# Altium footprint library PCB_CONNECTORS.PcbLib: 676 footprints (part 3 of 43)
Each footprint in its own frame and in the unit in brackets; x right, y up, seen from the top. Pads: shape width x height; smd on the part's side, far side on the other; paste and mask are expansions set on the pad; w line width, h text height; cw(c..) or ccw(c..) is an arc to the next point about the centre after c.
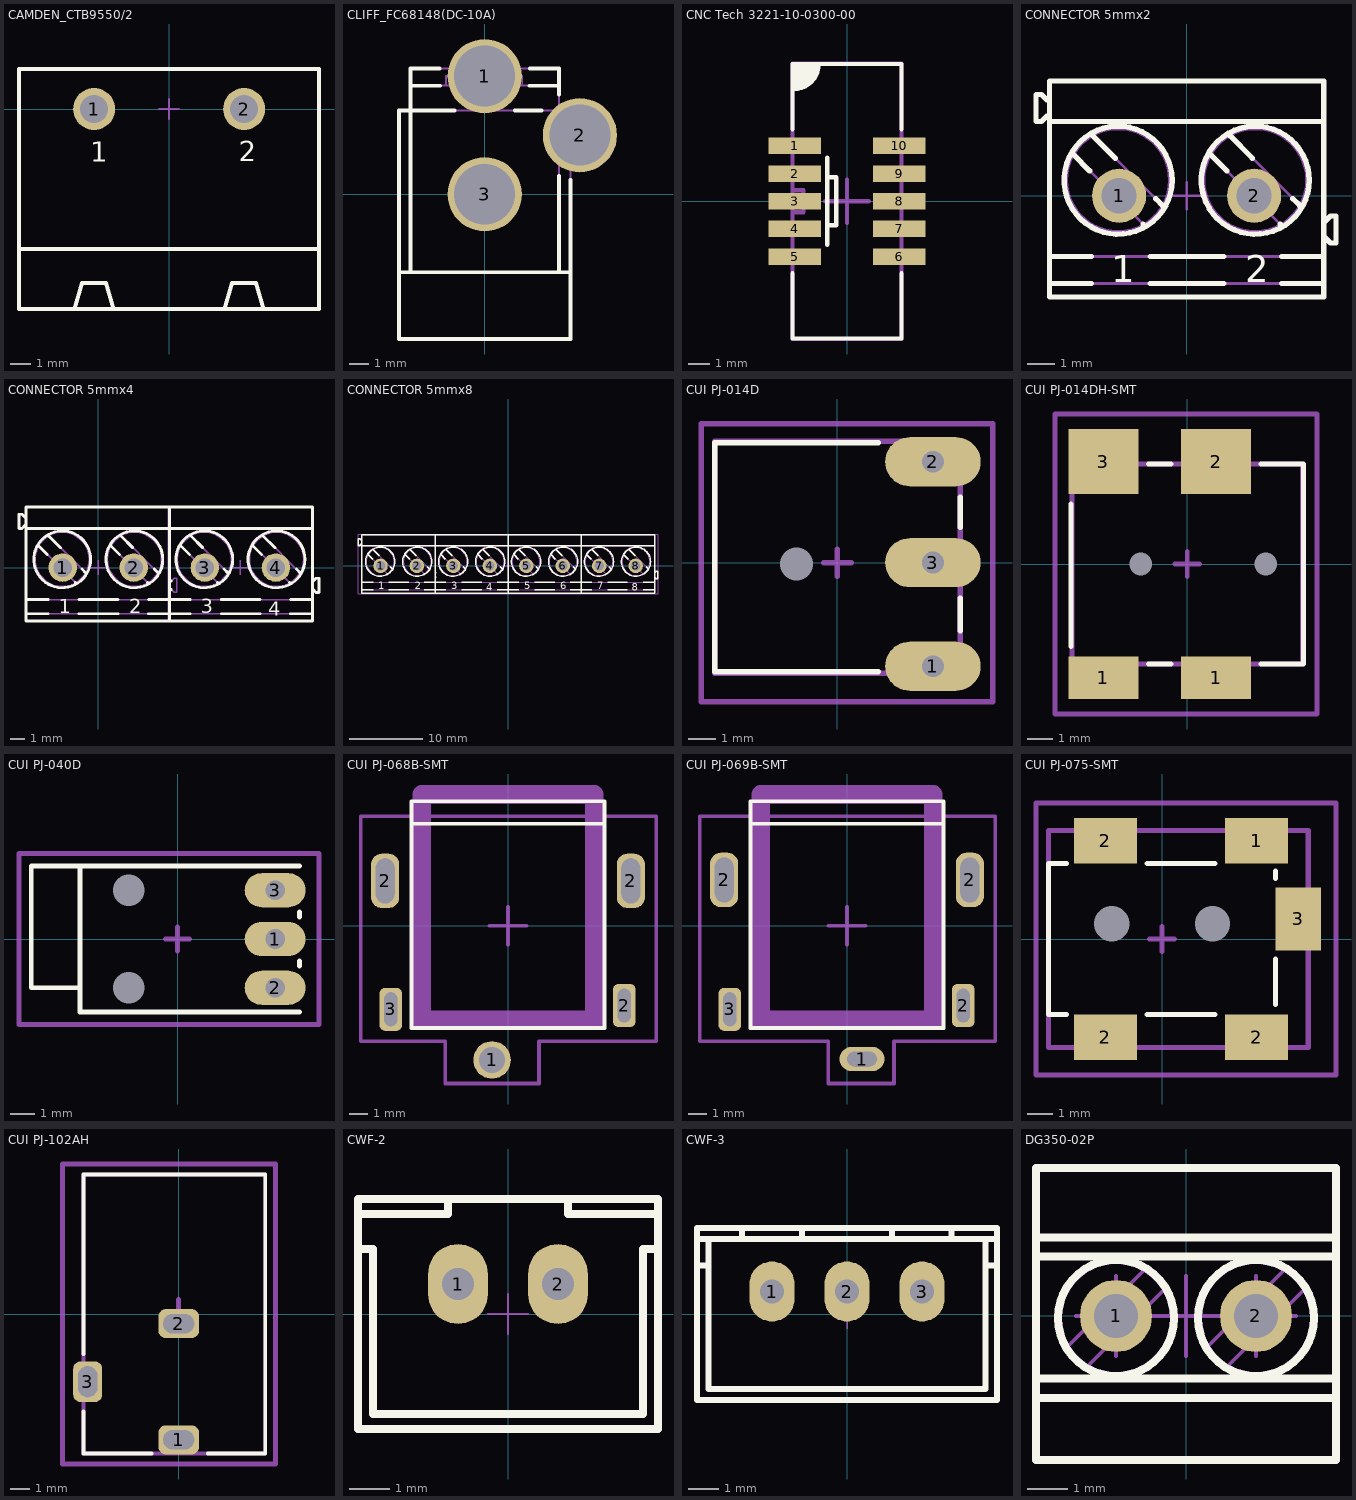
[diagram p2: the footprints below, top view; thin cyan lines are the x and y axes]

## CAMDEN_CTB9550/2 [mm] "12A, 750V, Pitch: 7.5mm, 2 Positions, Horizontal  Male Terminal Block"
height 8.3
pads (2):
  round 2.1 hole 1.4: 1(-3.75,0) 2(3.75,0)
Top Overlay:
  lines w0.2: -7.505,-7 7.495,-7 ; -4.73,-10 -4.36,-8.7 -3.15,-8.7 -2.78,-10 ; 2.77,-10 3.14,-8.7 4.35,-8.7 4.72,-10 ; -7.505,-10 -7.505,2 7.495,2 7.495,-10 -7.505,-10
  text "1" at -3.95,-2.65 h1
  text "2" at 3.49,-2.625 h1
Mechanical 8:
  lines w0.1: -4.25,0 -3.75,0 ; -3.75,-0.5 -3.75,0 ; -3.75,0.5 -3.75,0 ; -3.25,0 -3.75,0 ; -0.5,0 0,0 ; 0,-0.5 0,0 ; 0,0.5 0,0 ; 0.5,0 0,0 ; 3.25,0 3.75,0 ; 3.75,-0.5 3.75,0 ; 3.75,0.5 3.75,0 ; 4.25,0 3.75,0
Mechanical 14:
  lines w0.1: -7.505,-7 7.495,-7 ; -4.73,-10 -4.36,-8.7 -3.15,-8.7 -2.78,-10 ; 2.77,-10 3.14,-8.7 4.35,-8.7 4.72,-10 ; -7.505,-10 -7.505,2 7.495,2 7.495,-10 -7.505,-10
  text "1" at -3.95,-2.65 h1
  text "2" at 3.49,-2.625 h1
3D body "CAMDEN_CTB9550-2.stp": height 8.3, standoff -3.5, extent -7.505,-10 7.495,2

## CLIFF_FC68148(DC-10A) [mm] "12V /  5A, 2.1mm Diameter Pin, DC Power Socket With  Switch. DC10A Type"
height 11
pads (3):
  round 3.9 hole 3.2: 1(0,6.2) 2(5,3.1) 3(0,0)
Top Overlay:
  lines w0.2: -4.5,-4.1 4.5,-4.1 ; -3.9,-4.1 -3.9,6.6 -2.366,6.6 ; -3.9,5.7 -2.347,5.7 ; -1.587,4.4 -4.5,4.4 -4.5,-7.6 4.5,-7.6 4.5,0.753 ; 1.587,4.4 2.983,4.4 ; 2.347,5.7 3.9,5.7 ; 2.366,6.6 3.9,6.6 3.9,5.233 ; 3.9,-4.1 3.9,0.967
Mechanical 8:
  lines w0.1: -0.5,0 0,0 ; -0.5,6.2 0,6.2 ; 0,-0.5 0,0 ; 0,0.5 0,0 ; 0,5.7 0,6.2 ; 0,6.7 0,6.2 ; 0.5,0 0,0 ; 0.5,6.2 0,6.2 ; 4.5,3.1 5,3.1 ; 5,2.6 5,3.1 ; 5,3.6 5,3.1 ; 5.5,3.1 5,3.1
Mechanical 14:
  lines w0.1: -4.5,-4.1 4.5,-4.1 ; -3.9,-4.1 -3.9,6.6 -1.4,6.6 -1.4,6.2 ; -3.9,5.7 3.9,5.7 ; -2.029,5.7 -2.029,6.2 1.971,6.2 1.971,5.7 ; -1.372,6.2 cw(c-1.025,6.15) -1.025,6.5 0.975,6.5 ; 0.967,6.5 cw(c0.967,6.15) 1.314,6.2 ; 1.4,6.2 1.4,6.6 3.9,6.6 3.9,-4.1 ; 4.5,1.9 5.2,1.9 5.2,4.4 -4.5,4.4 -4.5,-7.6 4.5,-7.6 4.5,4.4 ; 5,1.9 5,4.4
3D body "CLIFF_FC68148(DC-10A).stp": height 11, standoff -3.5, extent -4.5,-7.6 5.2,6.6

## CNC Tech 3221-10-0300-00 [mm]
height 5.6
pads (10):
  rect 2.4x0.76 smd: 1(-2.4,2.54) 2(-2.4,1.27) 3(-2.4,0) 4(-2.4,-1.27) 5(-2.4,-2.54) 6(2.4,-2.54) 7(2.4,-1.27) 8(2.4,0) 9(2.4,1.27) 10(2.4,2.54)
Top Overlay:
  region: -1.3,6.3 -1.3,5.9 -2.05,5.15 -2.45,5.15 -2.45,6.25 -2.5,6.3
  lines w0.2: -2.5,-3.3 -2.5,-6.3 2.5,-6.3 2.5,-3.3 ; -2.5,3.3 -2.5,6.3 ; -2.5,5.15 -2.45,5.15 ccw(c-2.45,6.3) -1.3,6.3 ; -2.3,6.3 -2.5,6.3 ; -0.9,-2 -0.9,-1.1 ; -0.9,2 -0.9,1.1 ; 2.5,3.3 2.5,6.3 -2.5,6.3 ; -0.9,-1.1 -0.9,1.1 ; -0.9,-1.1 -0.5,-1.1 -0.5,1.1 -0.9,1.1
Mechanical 1:
  lines w0.2: -2.45,-0.5 -2,-0.5 -2,0 -2,0.5 -2.45,0.5 ; -2.5,-6.325 -2.5,6.325 2.5,6.325 2.5,-6.325 -2.5,-6.325
Mechanical 15:
  lines w0.2: -1,0 1,0 ; 0,-1 0,1
3D body "CNC Tech 3221-10-0300-00.STEP": height 5.6, standoff 0, extent -2.75,-6.325 2.75,6.325

## CONNECTOR 5mmx2 [mm] "Terminal Block, 24A 600V, Pitch 5.08mm, 2 Positions, Screw Connection"
height 10
pads (2):
  round 2 hole 1.3: 1(-2.5,0) 2(2.5,0)
Top Overlay:
  circle w0.2: c-2.54,0.577 r2
  circle w0.2: c2.54,0.577 r2
  lines w0.2: -5.08,-3.25 -3.525,-3.25 ; -5.08,-2.25 -3.525,-2.25 ; -5.08,2.75 5.08,2.75 ; -5.08,2.95 -5.18,2.95 -5.38,2.75 -5.58,2.75 -5.58,3.75 -5.38,3.75 -5.18,3.55 -5.08,3.55 ; -4.19,1.52 -3.593,0.923 ; -3.483,2.227 -2.651,1.396 ; -1.617,-1.053 -1.597,-1.073 ; -1.35,-3.25 1.375,-3.25 ; -1.35,-2.25 1.375,-2.25 ; -1.144,-0.111 -0.89,-0.366 ; 0.89,1.52 1.487,0.923 ; 1.597,2.227 2.429,1.396 ; 3.463,-1.053 3.483,-1.073 ; 3.525,-3.25 5.08,-3.25 ; 3.525,-2.25 5.08,-2.25 ; 3.936,-0.111 4.19,-0.366 ; 5.08,-1.55 5.13,-1.55 5.33,-1.75 5.53,-1.75 5.53,-0.75 5.33,-0.75 5.13,-0.95 5.08,-0.95 ; -5.08,-3.75 -5.08,4.25 5.08,4.25 5.08,-3.75 -5.08,-3.75
  text "1" at -2.792,-3.2 h1
  text "2" at 2.169,-3.2 h1
Mechanical 8:
  lines w0.1: -3.04,0 -2.54,0 ; -2.54,-0.5 -2.54,0 ; -2.54,0.5 -2.54,0 ; -2.04,0 -2.54,0 ; -0.5,0 0,0 ; 0,-0.5 0,0 ; 0,0.5 0,0 ; 0.5,0 0,0 ; 2.04,0 2.54,0 ; 2.54,-0.5 2.54,0 ; 2.54,0.5 2.54,0 ; 3.04,0 2.54,0
Mechanical 14:
  circle w0.1: c-2.54,0.577 r1.9
  circle w0.1: c-2.54,0.577 r2
  circle w0.1: c2.54,0.577 r1.9
  circle w0.1: c2.54,0.577 r2
  lines w0.1: -5.08,-3.25 5.08,-3.25 ; -5.08,-2.25 5.08,-2.25 ; -5.08,2.75 5.08,2.75 ; -5.08,2.95 -5.18,2.95 -5.38,2.75 -5.58,2.75 -5.58,3.75 -5.38,3.75 -5.18,3.55 -5.08,3.55 ; -4.19,1.52 -1.597,-1.073 ; -3.483,2.227 -0.89,-0.366 ; 0.89,1.52 3.483,-1.073 ; 1.597,2.227 4.19,-0.366 ; 5.08,-1.55 5.13,-1.55 5.33,-1.75 5.53,-1.75 5.53,-0.75 5.33,-0.75 5.13,-0.95 5.08,-0.95 ; -5.08,-3.75 -5.08,4.25 5.08,4.25 5.08,-3.75 -5.08,-3.75
  text "2" at 2.169,-3.2 h1
  text "1" at -2.792,-3.2 h1
3D body "WEIDMULLER_1760490000.stp": height 10, standoff -3.5, extent -5.58,-3.75 5.53,4.25

## CONNECTOR 5mmx4 [mm] "Terminal Block, 24A 600V, Pitch 5.08mm, 2 Positions, Screw Connection"
height 10
pads (4):
  round 2 hole 1.3: 1(-2.5,0) 2(2.5,0) 3(7.5,0) 4(12.5,0)
Top Overlay:
  circle w0.2: c12.54,0.577 r2
  circle w0.2: c7.46,0.577 r2
  circle w0.2: c-2.54,0.577 r2
  circle w0.2: c2.54,0.577 r2
  lines w0.2: -5.08,-3.25 -3.525,-3.25 ; -5.08,-2.25 -3.525,-2.25 ; -5.08,2.75 5.08,2.75 ; -5.08,2.95 -5.18,2.95 -5.38,2.75 -5.58,2.75 -5.58,3.75 -5.38,3.75 -5.18,3.55 -5.08,3.55 ; -4.19,1.52 -3.593,0.923 ; -3.483,2.227 -2.651,1.396 ; -1.617,-1.053 -1.597,-1.073 ; -1.35,-3.25 1.375,-3.25 ; -1.35,-2.25 1.375,-2.25 ; -1.144,-0.111 -0.89,-0.366 ; 0.89,1.52 1.487,0.923 ; 1.597,2.227 2.429,1.396 ; 3.463,-1.053 3.483,-1.073 ; 3.525,-3.25 5.08,-3.25 ; 3.525,-2.25 5.08,-2.25 ; 3.936,-0.111 4.19,-0.366 ; 4.92,-3.25 6.475,-3.25 ; 4.92,-2.25 6.475,-2.25 ; 4.92,2.75 15.08,2.75 ; 5.08,-1.55 5.13,-1.55 ; 5.08,-0.95 5.13,-0.95 ; 5.81,1.52 6.407,0.923 ; 6.517,2.227 7.349,1.396 ; 8.383,-1.053 8.403,-1.073 ; 8.65,-3.25 11.375,-3.25 ; 8.65,-2.25 11.375,-2.25 ; 8.856,-0.111 9.11,-0.366 ; 10.89,1.52 11.487,0.923 ; 11.597,2.227 12.429,1.396 ; 13.463,-1.053 13.483,-1.073 ; 13.525,-3.25 15.08,-3.25 ; 13.525,-2.25 15.08,-2.25 ; 13.936,-0.111 14.19,-0.366 ; 15.08,-1.55 15.13,-1.55 15.33,-1.75 15.53,-1.75 15.53,-0.75 15.33,-0.75 15.13,-0.95 15.08,-0.95 ; 5,-3.75 15.08,-3.75 15.08,4.25 5,4.25 ; 5,-3.75 5,4.25 ; 5,-3.75 -5.08,-3.75 -5.08,4.25 5,4.25 ; 5,-3.75 5,4.25
  text "4" at 11.969,-3.4 h1
  text "3" at 7.208,-3.2 h1
  text "1" at -2.792,-3.2 h1
  text "2" at 2.169,-3.2 h1
Mechanical 8:
  lines w0.1: -3.04,0 -2.54,0 ; -2.54,-0.5 -2.54,0 ; -2.54,0.5 -2.54,0 ; -2.04,0 -2.54,0 ; -0.5,0 0,0 ; 0,-0.5 0,0 ; 0,0.5 0,0 ; 0.5,0 0,0 ; 2.04,0 2.54,0 ; 2.54,-0.5 2.54,0 ; 2.54,0.5 2.54,0 ; 3.04,0 2.54,0 ; 6.96,0 7.46,0 ; 7.46,-0.5 7.46,0 ; 7.46,0.5 7.46,0 ; 7.96,0 7.46,0 ; 9.5,0 10,0 ; 10,-0.5 10,0 ; 10,0.5 10,0 ; 10.5,0 10,0 ; 12.04,0 12.54,0 ; 12.54,-0.5 12.54,0 ; 12.54,0.5 12.54,0 ; 13.04,0 12.54,0
Mechanical 14:
  circle w0.1: c12.54,0.577 r2
  circle w0.1: c12.54,0.577 r1.9
  circle w0.1: c7.46,0.577 r2
  circle w0.1: c7.46,0.577 r1.9
  circle w0.1: c-2.54,0.577 r1.9
  circle w0.1: c-2.54,0.577 r2
  circle w0.1: c2.54,0.577 r1.9
  circle w0.1: c2.54,0.577 r2
  lines w0.1: -5.08,-3.25 5.08,-3.25 ; -5.08,-2.25 5.08,-2.25 ; -5.08,2.75 5.08,2.75 ; -5.08,2.95 -5.18,2.95 -5.38,2.75 -5.58,2.75 -5.58,3.75 -5.38,3.75 -5.18,3.55 -5.08,3.55 ; -4.19,1.52 -1.597,-1.073 ; -3.483,2.227 -0.89,-0.366 ; 0.89,1.52 3.483,-1.073 ; 1.597,2.227 4.19,-0.366 ; 4.92,-3.25 15.08,-3.25 ; 4.92,-2.25 15.08,-2.25 ; 4.92,2.75 15.08,2.75 ; 5.08,-1.55 5.13,-1.55 5.33,-1.75 5.53,-1.75 5.53,-0.75 5.33,-0.75 5.13,-0.95 5.08,-0.95 ; 5.81,1.52 8.403,-1.073 ; 6.517,2.227 9.11,-0.366 ; 10.89,1.52 13.483,-1.073 ; 11.597,2.227 14.19,-0.366 ; 15.08,-1.55 15.13,-1.55 15.33,-1.75 15.53,-1.75 15.53,-0.75 15.33,-0.75 15.13,-0.95 15.08,-0.95 ; -5.08,-3.75 -5.08,4.25 5.08,4.25 5.08,-3.75 -5.08,-3.75 ; 4.92,-3.75 15.08,-3.75 15.08,4.25 4.92,4.25 4.92,-3.75
  text "3" at 7.208,-3.2 h1
  text "4" at 11.969,-3.4 h1
  text "2" at 2.169,-3.2 h1
  text "1" at -2.792,-3.2 h1
3D body "WEIDMULLER_1760490000.stp": height 10, standoff -3.5, extent 4.42,-3.75 15.53,4.25
3D body "WEIDMULLER_1760490000.stp": height 10, standoff -3.5, extent -5.58,-3.75 5.53,4.25

## CONNECTOR 5mmx8 [mm] "Terminal Block, 24A 600V, Pitch 5.08mm, 2 Positions, Screw Connection"
height 10
pads (8):
  round 2 hole 1.3: 1(-17.511,0) 2(-12.511,0) 3(-7.511,0) 4(-2.511,0) 5(2.489,0) 6(7.489,0) 7(12.489,0) 8(17.489,0)
Top Overlay:
  circle w0.2: c17.529,0.577 r2
  circle w0.2: c12.449,0.577 r2
  circle w0.2: c2.449,0.577 r2
  circle w0.2: c7.529,0.577 r2
  circle w0.2: c-12.471,0.577 r2
  circle w0.2: c-17.551,0.577 r2
  circle w0.2: c-7.551,0.577 r2
  circle w0.2: c-2.471,0.577 r2
  lines w0.2: -20.091,-3.25 -18.536,-3.25 ; -20.091,-2.25 -18.536,-2.25 ; -20.091,2.75 -9.931,2.75 ; -20.091,2.95 -20.191,2.95 -20.391,2.75 -20.591,2.75 -20.591,3.75 -20.391,3.75 -20.191,3.55 -20.091,3.55 ; -19.2,1.52 -18.603,0.923 ; -18.493,2.227 -17.662,1.396 ; -16.628,-1.053 -16.608,-1.073 ; -16.361,-3.25 -13.636,-3.25 ; -16.361,-2.25 -13.636,-2.25 ; -16.155,-0.111 -15.901,-0.366 ; -14.12,1.52 -13.523,0.923 ; -13.413,2.227 -12.582,1.396 ; -11.548,-1.053 -11.528,-1.073 ; -11.486,-3.25 -9.931,-3.25 ; -11.486,-2.25 -9.931,-2.25 ; -11.075,-0.111 -10.821,-0.366 ; -10.091,-3.25 -8.536,-3.25 ; -10.091,-2.25 -8.536,-2.25 ; -10.091,2.75 0.069,2.75 ; -9.931,-1.55 -9.881,-1.55 ; -9.931,-0.95 -9.881,-0.95 ; -9.2,1.52 -8.603,0.923 ; -8.493,2.227 -7.662,1.396 ; -6.628,-1.053 -6.608,-1.073 ; -6.361,-3.25 -3.636,-3.25 ; -6.361,-2.25 -3.636,-2.25 ; -6.155,-0.111 -5.901,-0.366 ; -4.12,1.52 -3.523,0.923 ; -3.413,2.227 -2.582,1.396 ; -1.548,-1.053 -1.528,-1.073 ; -1.486,-3.25 0.069,-3.25 ; -1.486,-2.25 0.069,-2.25 ; -1.075,-0.111 -0.821,-0.366 ; -0.091,-3.25 1.464,-3.25 ; -0.091,-2.25 1.464,-2.25 ; -0.091,2.75 10.069,2.75 ; 0.8,1.52 1.397,0.923 ; 1.507,2.227 2.338,1.396 ; 3.372,-1.053 3.392,-1.073 ; 3.639,-3.25 6.364,-3.25 ; 3.639,-2.25 6.364,-2.25 ; 3.845,-0.111 4.099,-0.366 ; 5.88,1.52 6.477,0.923 ; 6.587,2.227 7.418,1.396 ; 8.452,-1.053 8.472,-1.073 ; 8.514,-3.25 10.069,-3.25 ; 8.514,-2.25 10.069,-2.25 ; 8.925,-0.111 9.179,-0.366 ; 9.909,-3.25 11.464,-3.25 ; 9.909,-2.25 11.464,-2.25 ; 9.909,2.75 20.069,2.75 ; 10.069,-1.55 10.119,-1.55 ; 10.069,-0.95 10.119,-0.95 ; 10.8,1.52 11.397,0.923 ; 11.507,2.227 12.338,1.396 ; 13.372,-1.053 13.392,-1.073 ; 13.639,-3.25 16.364,-3.25 ; 13.639,-2.25 16.364,-2.25 ; 13.845,-0.111 14.099,-0.366 ; 15.88,1.52 16.477,0.923 ; 16.587,2.227 17.418,1.396 ; 18.452,-1.053 18.472,-1.073 ; 18.514,-3.25 20.069,-3.25 ; 18.514,-2.25 20.069,-2.25 ; 18.925,-0.111 19.179,-0.366 ; 20.069,-1.55 20.119,-1.55 20.319,-1.75 20.519,-1.75 20.519,-0.75 20.319,-0.75 20.119,-0.95 20.069,-0.95 ; -10.011,-3.75 -10.011,4.25 ; -10.011,-3.75 -20.091,-3.75 -20.091,4.25 -10.011,4.25 ; -10.011,-3.75 -10.011,4.25 ; -10.011,-3.75 -0.011,-3.75 ; -10.011,4.25 -0.011,4.25 ; -0.011,-3.75 -0.011,4.25 ; -0.011,-3.75 9.989,-3.75 ; -0.011,-3.75 -0.011,4.25 ; -0.011,4.25 9.989,4.25 ; 9.989,-3.75 20.069,-3.75 20.069,4.25 9.989,4.25 ; 9.989,-3.75 9.989,4.25 ; 9.989,-3.75 9.989,4.25
  text "8" at 16.959,-3.4 h1
  text "7" at 12.197,-3.2 h1
  text "5" at 2.197,-3.2 h1
  text "6" at 7.159,-3.2 h1
  text "2" at -12.841,-3.2 h1
  text "1" at -17.803,-3.2 h1
  text "3" at -7.803,-3.2 h1
  text "4" at -3.041,-3.4 h1
Mechanical 14:
  circle w0.1: c17.529,0.577 r1.9
  circle w0.1: c2.449,0.577 r1.9
  circle w0.1: c7.529,0.577 r1.9
  circle w0.1: c-12.471,0.577 r1.9
  circle w0.1: c-17.551,0.577 r1.9
  circle w0.1: c-7.551,0.577 r1.9
  circle w0.1: c-2.471,0.577 r1.9
  circle w0.1: c12.449,0.577 r1.9
  lines w0.1: -20.091,-3.25 -9.931,-3.25 ; -20.091,-2.25 -9.931,-2.25 ; -20.091,2.75 -9.931,2.75 ; -20.091,2.95 -20.191,2.95 -20.391,2.75 -20.591,2.75 -20.591,3.75 -20.391,3.75 -20.191,3.55 -20.091,3.55 ; -19.2,1.52 -16.608,-1.073 ; -18.493,2.227 -15.901,-0.366 ; -14.12,1.52 -11.528,-1.073 ; -13.413,2.227 -10.821,-0.366 ; -10.091,-3.25 0.069,-3.25 ; -10.091,-2.25 0.069,-2.25 ; -10.091,2.75 0.069,2.75 ; -9.2,1.52 -6.608,-1.073 ; -8.493,2.227 -5.901,-0.366 ; -4.12,1.52 -1.528,-1.073 ; -3.413,2.227 -0.821,-0.366 ; -0.091,-3.25 10.069,-3.25 ; -0.091,-2.25 10.069,-2.25 ; -0.091,2.75 10.069,2.75 ; 0.8,1.52 3.392,-1.073 ; 1.507,2.227 4.099,-0.366 ; 5.88,1.52 8.472,-1.073 ; 6.587,2.227 9.179,-0.366 ; 9.909,-3.25 20.069,-3.25 ; 9.909,-2.25 20.069,-2.25 ; 9.909,2.75 20.069,2.75 ; 10.8,1.52 13.392,-1.073 ; 11.507,2.227 14.099,-0.366 ; 15.88,1.52 18.472,-1.073 ; 16.587,2.227 19.179,-0.366 ; 20.069,-1.55 20.119,-1.55 20.319,-1.75 20.519,-1.75 20.519,-0.75 20.319,-0.75 20.119,-0.95 20.069,-0.95 ; -9.931,-3.75 -9.931,4.25 ; -9.931,-3.75 -20.091,-3.75 -20.091,4.25 -9.931,4.25 ; -9.931,-3.75 -9.931,4.25 ; -9.931,-3.75 0.069,-3.75 ; -9.931,4.25 0.069,4.25 ; 0.069,-3.75 0.069,4.25 ; 0.069,-3.75 10.069,-3.75 10.069,4.25 0.069,4.25 ; 0.069,-3.75 0.069,4.25 ; 10.119,-3.75 20.069,-3.75 20.069,4.25 10.119,4.25 10.119,-3.75
  text "7" at 12.197,-3.2 h1
  text "8" at 16.959,-3.4 h1
  text "6" at 7.159,-3.2 h1
  text "5" at 2.197,-3.2 h1
  text "1" at -17.803,-3.2 h1
  text "2" at -12.841,-3.2 h1
  text "4" at -3.041,-3.4 h1
  text "3" at -7.803,-3.2 h1
  text "Провода вставляются с этой стороны" at -18.313,-5.715 h2.5
  text ".Designator" at -20.091,4.25 h2.5
  text ".Comment" at 1.372,4.699 h2.5
Mechanical 15:
  lines w0.05: -0.5,0 0.5,0 ; 0,-0.5 0,0.5
  lines w0.1: -20.599,-3.81 20.549,-3.81 20.549,-3.683 20.549,4.318 -20.599,4.318 -20.599,-3.81
3D body "WEIDMULLER_1760490000.stp": height 10, standoff -3.5, extent 9.41,-3.75 20.52,4.25
3D body "WEIDMULLER_1760490000.stp": height 10, standoff -3.5, extent -0.59,-3.75 10.52,4.25
3D body "WEIDMULLER_1760490000.stp": height 10, standoff -3.5, extent -20.59,-3.75 -9.48,4.25
3D body "WEIDMULLER_1760490000.stp": height 10, standoff -3.5, extent -10.59,-3.75 0.52,4.25

## CUI PJ-014D [mm]
height 5.5
pads (4):
  oval 3.5x1.8 hole 0.8 square: 1(3.5,-3.8) 2(3.5,3.7) 3(3.5,0)
  round 0 hole 1.2 unplated: M(-1.5,-0.05)
Top Overlay:
  lines w0.2: 1.5,-4 -4.5,-4 -4.5,4.4 1.5,4.4 ; 4.5,-2.5 4.5,-1.3 ; 4.5,1.3 4.5,2.4
Mechanical 1:
  lines w0.2: -4.5,-4.05 -4.5,4.45 4.5,4.45 4.5,-4.05 -4.5,-4.05
Mechanical 15:
  lines w0.2: -0.5,0 0.5,0 ; 0,-0.5 0,0.5 ; -5,-5.1 -5,5.1 5.7,5.1 5.7,-5.1 -5,-5.1
3D body "CUI PJ-014D.STEP": height 5.5, standoff -3.5, extent -4.5,-4.05 4.5,4.45

## CUI PJ-014DH-SMT [mm]
height 5.7
pads (6):
  rect 2.8x1.7 smd: 1(-3.35,-4.55) 1(1.15,-4.55)
  rect 2.8x2.6 smd: 2(1.15,4.1) 3(-3.35,4.1)
  round 0 hole 0.9 unplated: M(-1.85,0) M(3.15,0)
Top Overlay:
  lines w0.2: -4.65,-3.3 -4.65,2.4 ; -1.55,-4 -0.65,-4 ; -1.55,4 -0.65,4 ; 2.95,-4 4.65,-4 4.65,4 2.95,4
Mechanical 1:
  lines w0.2: -4.6,-4 -4.6,4 4.6,4 4.6,-4 -4.6,-4
Mechanical 15:
  lines w0.2: -0.5,0 0.5,0 ; 0,-0.5 0,0.5 ; -5.3,-6 5.2,-6 5.2,6 -5.3,6 -5.3,-6
3D body "CUI PJ-014DH-SMT.STEP": height 5.4, standoff -0.6, extent -4.65,-4.8 4.65,4.8

## CUI PJ-040D [mm]
height 5
pads (5):
  oval 2.5x1.4 hole 0.8 square: 1(4,0) 2(4,-2) 3(4,2)
  round 0 hole 1.3 unplated: M(-2,-2) M(-2,2)
Top Overlay:
  lines w0.2: -4,3 -4,-2 ; 5,-3 -4,-3 -4,-2 ; 5,-1.1 5,-0.9 ; 5,0.9 5,1.1 ; 5,3 -6,3 -6,-2 -4,-2
Mechanical 15:
  lines w0.2: -0.5,0 0.5,0 ; 0,-0.5 0,0.5 ; -6.5,-3.5 -6.5,3.5 5.8,3.5 5.8,-3.5 -6.5,-3.5
3D body "CUI pj-040d.STEP": height 5, standoff -3, extent -6,-3 5,3

## CUI PJ-068B-SMT [mm] "Mid Mount DC Power Jack"
height 5.45
pads (5):
  round 2 hole 1.4 unplated: 1(-0.85,-7.15)
  rrect75% 1.5x2.9 hole 1 slot 2.4 at 90 deg unplated: 2(-6.55,2.4) 2(6.55,2.4)
  rrect50% 1.2x2.3 hole 0.7 slot 1.8 at 90 deg unplated: 2(6.2,-4.25) 3(-6.25,-4.45)
Top Overlay:
  lines w0.2: -5.15,5.45 -0.85,5.45 5.15,5.45 ; -5.15,5.45 -5.15,-5.45 5.15,-5.45 5.15,5.45 ; -5.15,5.45 -5.15,6.65 5.15,6.65 5.15,5.45
Mechanical 15:
  lines w0.2: -1,0 1,0 ; 0,-1 0,1 ; -7.85,-6.15 -3.35,-6.15 -3.35,-8.4 -0.85,-8.4 1.65,-8.4 1.65,-6.15 7.9,-6.15 7.9,5.85 -7.85,5.85 -7.85,-6.15
Mechanical 31:
  lines w0.6: -4.8,-4.5 -4.8,-5.2 -4,-5.2 ; 4,-5.2 4.8,-5.2 4.8,-4.5
  lines w1: -4.6,-5 4.6,-5 4.6,7 -4.6,7 -4.6,-5
3D body "pj-068b-smt.STEP": height 5.45, standoff -3.65, extent -6.55,-7.7 6.55,6.6

## CUI PJ-069B-SMT [mm] "Mid Mount DC Power Jack"
height 2.45
pads (5):
  oval 2.4x1.3 hole 0.8 slot 1.6 at 0 deg unplated: 1(0.8,-7.1)
  rrect75% 1.5x2.9 hole 1 slot 2.4 at 90 deg unplated: 2(-6.55,2.45) 2(6.55,2.45)
  rrect50% 1.2x2.3 hole 0.7 slot 1.8 at 90 deg unplated: 2(6.2,-4.25) 3(-6.25,-4.45)
Top Overlay:
  lines w0.2: -5.15,5.45 -0.85,5.45 5.15,5.45 ; -5.15,5.45 -5.15,-5.45 5.15,-5.45 5.15,5.45 ; -5.15,5.45 -5.15,6.65 5.15,6.65 5.15,5.45
Mechanical 15:
  lines w0.2: -1,0 1,0 ; 0,-1 0,1 ; -7.85,-6.15 -1,-6.15 -1,-8.4 -0.85,-8.4 2.5,-8.4 2.5,-6.15 7.9,-6.15 7.9,5.85 -7.85,5.85 -7.85,-6.15
Mechanical 31:
  lines w0.6: -4.8,-4.5 -4.8,-5.2 -4,-5.2 ; 4,-5.2 4.8,-5.2 4.8,-4.5
  lines w1: -4.6,-5 4.6,-5 4.6,7 -4.6,7 -4.6,-5
3D body "PJ-069B-SMT.STEP": height 2.55, standoff -6.45, extent -6.55,-7.35 6.55,6.6

## CUI PJ-075-SMT [mm]
height 4.8
pads (7):
  rect 2.5x1.8 smd: 1(3.75,3.9) 2(-2.25,-3.9) 2(-2.25,3.9) 2(3.75,-3.9)
  rect 1.8x2.5 smd: 3(5.4,0.8)
  round 0 hole 1.4 unplated: M(-2,0.6) M(2,0.6)
Top Overlay:
  lines w0.2: -3.8,-3 -4.5,-3 -4.5,3 -3.8,3 ; -0.6,-3 2.1,-3 ; -0.6,3 2.1,3 ; 4.5,-2.6 4.5,-0.8 ; 4.5,2.4 4.5,2.7
Mechanical 1:
  lines w0.2: -4.5,-4.3 -4.5,4.3 5.8,4.3 5.8,-4.3 -4.5,-4.3
Mechanical 31:
  lines w0.2: -0.5,0 0.5,0 ; 0,-0.5 0,0.5 ; -5,-5.4 6.9,-5.4 6.9,5.4 -5,5.4 -5,-5.4
3D body "CUI PJ-075DH-SMT.STEP": height 4.8, standoff -0.4, extent -4.5,-4.3 5.8,4.3

## CUI PJ-102AH [mm] "DC Barrel Jack W/ Switch 2.0x5.5"
height 11
pads (3):
  rrect50% 2.1x1.5 hole 1 slot 1.6 at 0 deg: 1(0,-6.5) 2(0,-0.5)
  rrect50% 1.5x2.1 hole 1 slot 1.6 at 90 deg: 3(-4.7,-3.5)
Top Overlay:
  lines w0.2: -4.925,-5.025 -4.925,-7.2 -1.4,-7.2 ; -4.925,-2.075 -4.925,7.2 4.475,7.2 4.475,-6.525 4.475,-7.2 1.5,-7.2
Mechanical 1:
  lines w0.2: -4.925,-7.2 4.475,-7.2 4.475,7.2 -4.925,7.2 -4.925,-7.2
Mechanical 15:
  lines w0.254: -0.75,0 0,0 ; 0,-0.75 0,0 ; 0,0.75 0,0 ; 0.75,0 0,0 ; -6,-7.75 5,-7.75 5,7.75 -6,7.75 -6,-3.5 -6,-7.75
3D body "CUI-PJ-102AH.step": height 11, standoff -3.5, extent -4.925,-7.2 4.475,7.2

## CWF-2 [mm]
pads (2):
  oval 1.5x2 hole 0.8: 1(-1.25,0.75) 2(1.25,0.75)
Top Overlay:
  lines w0.2: -3.75,1.625 -3.375,1.625 -3.375,-2.475 -3.375,-2.5 3.375,-2.5 3.375,1.625 3.75,1.625 ; -3.75,2.5 -1.5,2.5 -1.5,2.875 ; 1.5,2.875 1.5,2.5 3.7,2.5 ; -3.75,-2.875 -3.75,2.875 3.75,2.875 3.75,-2.875 -3.75,-2.875
Mechanical 14:
  lines w0.1: -3.75,1.625 -3.375,1.625 -3.375,-2.475 -3.375,-2.5 3.375,-2.5 3.375,1.625 3.75,1.625 ; -3.75,2.5 -1.5,2.5 -1.5,2.875 ; 1.5,2.875 1.5,2.5 3.7,2.5 ; -3.75,-2.875 3.75,-2.875 3.75,2.875 -3.75,2.875 -3.75,-2.875
  text ".Designator" at -3.2,-0.575 h1.52
  text ".Comment" at -2.475,-4.025 h1.5
Mechanical 15:
  lines w0.05: -0.5,0 0.5,0 ; 0,-0.5 0,0.5 ; -3.75,-2.875 -3.75,2.875 3.75,2.875 3.75,-2.875 -3.75,-2.875
3D body "User Library-CWF-2.step": height 7, standoff -3.5, extent -3.75,-2.875 3.75,2.875

## CWF-3 [mm]
pads (3):
  oval 1.5x2 hole 0.8: 1(-2.5,0.75) 2(0,0.75) 3(2.5,0.75)
Top Overlay:
  lines w0.2: -5,1.625 -4.625,1.625 ; -5,2.5 -3.5,2.5 ; -4.625,2.5 -4.625,1.625 ; -3.5,2.875 -3.5,2.5 ; -1.5,2.875 -1.5,2.5 1.5,2.5 1.5,2.875 ; 3.475,2.875 3.475,2.5 4.975,2.5 ; 5,1.625 4.625,1.625 ; -4.625,1.625 -4.625,-2.475 -4.625,-2.5 4.625,-2.5 4.625,1.625 ; -3.5,2.5 4.625,2.5 4.625,1.625 ; -5,-2.875 -5,2.875 5,2.875 5,-2.875 -5,-2.875
Mechanical 14:
  lines w0.1: -5,1.625 -4.625,1.625 ; -5,2.5 -3.5,2.5 ; -4.625,2.5 -4.625,1.625 ; -3.5,2.875 -3.5,2.5 ; -1.5,2.875 -1.5,2.5 1.5,2.5 1.5,2.875 ; 3.475,2.875 3.475,2.5 4.975,2.5 ; 5,1.625 4.625,1.625 ; -4.625,1.625 -4.625,-2.475 -4.625,-2.5 4.625,-2.5 4.625,1.625 ; -3.5,2.5 4.625,2.5 4.625,1.625 ; -5,-2.875 5,-2.875 5,2.875 -5,2.875 -5,-2.875
  text ".Comment" at -2.475,-4.025 h1.5
  text ".Designator" at -3.2,-0.575 h1.52
Mechanical 15:
  lines w0.05: -0.5,0 0.5,0 ; 0,-0.5 0,0.5 ; -5,-2.875 5,-2.875 5,2.875 -5,2.875 -5,-2.875
3D body "User Library-CWF-3.step": height 7, standoff -3.5, extent -5,-2.875 5,2.875

## DG350-02P [mm] "Terminal Block, 10A 160V, Pitch 3.5mm, 2 Positions, Screw Connection"
height 8.5
pads (2):
  round 1.8 hole 1.1: 1(-1.75,0) 2(1.75,0)
Top Overlay:
  circle w0.2: c-1.75,-0.05 r1.45
  circle w0.2: c1.75,-0.05 r1.45
  lines w0.2: -3.75,-2.049 3.75,-2.049 ; -3.75,-1.566 3.75,-1.566 ; -3.75,1.487 3.75,1.487 ; -3.75,1.962 3.75,1.962 ; -3.75,-3.6 3.75,-3.6 3.75,3.7 -3.75,3.7 -3.75,-3.6
Mechanical 8:
  lines w0.1: -2.75,0 -1.75,0 ; -1.75,-1 -1.75,0 ; -1.75,1 -1.75,0 ; -1,0 0,0 ; -0.75,0 -1.75,0 ; 0,-1 0,0 ; 0,1 0,0 ; 0.75,0 1.75,0 ; 1,0 0,0 ; 1.75,-1 1.75,0 ; 1.75,1 1.75,0 ; 2.75,0 1.75,0
Mechanical 14:
  circle w0.1: c-1.75,-0.05 r1.45
  circle w0.1: c1.75,-0.05 r1.45
  circle w0.1: c-1.75,-0.05 r1.4
  circle w0.1: c1.75,-0.05 r1.4
  lines w0.1: -3.75,-2.049 3.75,-2.049 ; -3.75,-1.566 3.75,-1.566 ; -3.75,1.487 3.75,1.487 ; -3.75,1.962 3.75,1.962 ; -2.956,-0.761 -1.039,1.156 ; -2.461,-1.256 -0.544,0.661 ; 0.544,-0.761 2.461,1.156 ; 1.039,-1.256 2.956,0.661 ; -3.75,-3.6 3.75,-3.6 3.75,3.7 -3.75,3.7 -3.75,-3.6
3D body "PHOENIX_1751248.stp": height 8.5, standoff -3.5, extent -3.75,-3.6 3.75,3.7